# Altium footprint library ref-packages.PCBLIB: 1543 footprints (part 36 of 103)
Each footprint in its own frame and in the unit in brackets; x right, y up, seen from the top. Pads: shape width x height; smd on the part's side, far side on the other; paste and mask are expansions set on the pad; w line width, h text height; cw(c..) or ccw(c..) is an arc to the next point about the centre after c.
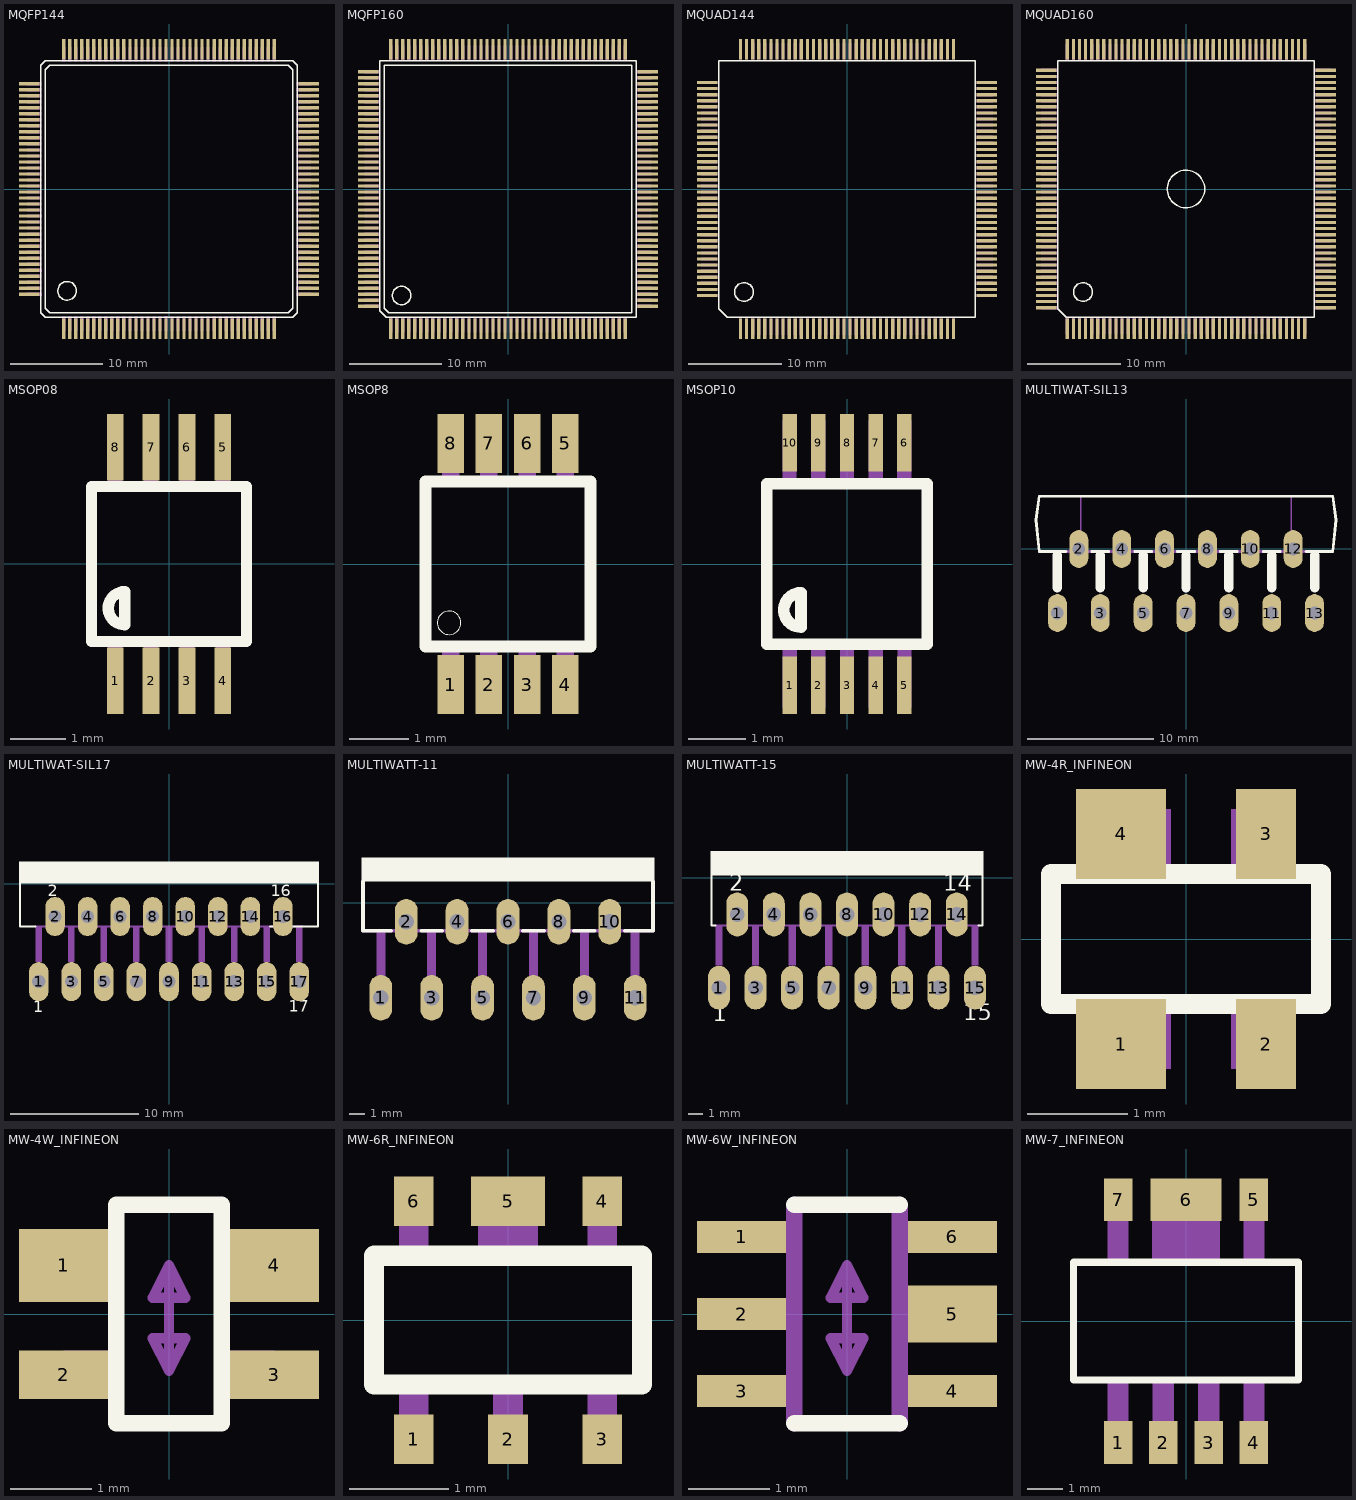
[diagram p35: the footprints below, top view; thin cyan lines are the x and y axes]

## MQFP144 [mm]
pads (144):
  rect 0.35x2.2 smd: 1(-11.375,-15.1) 2(-10.725,-15.1) 3(-10.075,-15.1) 4(-9.425,-15.1) 5(-8.775,-15.1) 6(-8.125,-15.1) 7(-7.475,-15.1) 8(-6.825,-15.1) 9(-6.175,-15.1) 10(-5.525,-15.1) 11(-4.875,-15.1) 12(-4.225,-15.1) 13(-3.575,-15.1) 14(-2.925,-15.1) 15(-2.275,-15.1) 16(-1.625,-15.1) 17(-0.975,-15.1) 18(-0.325,-15.1) 19(0.325,-15.1) 20(0.975,-15.1) 21(1.625,-15.1) 22(2.275,-15.1) 23(2.925,-15.1) 24(3.575,-15.1) 25(4.225,-15.1) 26(4.875,-15.1) 27(5.525,-15.1) 28(6.175,-15.1) 29(6.825,-15.1) 30(7.475,-15.1) 31(8.125,-15.1) 32(8.775,-15.1) 33(9.425,-15.1) 34(10.075,-15.1) 35(10.725,-15.1) 36(11.375,-15.1) 73(11.375,15.1) 74(10.725,15.1) 75(10.075,15.1) 76(9.425,15.1) 77(8.775,15.1) 78(8.125,15.1) 79(7.475,15.1) 80(6.825,15.1) 81(6.175,15.1) 82(5.525,15.1) 83(4.875,15.1) 84(4.225,15.1) 85(3.575,15.1) 86(2.925,15.1) 87(2.275,15.1) 88(1.625,15.1) 89(0.975,15.1) 90(0.325,15.1) 91(-0.325,15.1) 92(-0.975,15.1) 93(-1.625,15.1) 94(-2.275,15.1) 95(-2.925,15.1) 96(-3.575,15.1) 97(-4.225,15.1) 98(-4.875,15.1) 99(-5.525,15.1) 100(-6.175,15.1) 101(-6.825,15.1) 102(-7.475,15.1) 103(-8.125,15.1) 104(-8.775,15.1) 105(-9.425,15.1) 106(-10.075,15.1) 107(-10.725,15.1) 108(-11.375,15.1)
  rect 2.2x0.35 smd: 37(15.1,-11.375) 38(15.1,-10.725) 39(15.1,-10.075) 40(15.1,-9.425) 41(15.1,-8.775) 42(15.1,-8.125) 43(15.1,-7.475) 44(15.1,-6.825) 45(15.1,-6.175) 46(15.1,-5.525) 47(15.1,-4.875) 48(15.1,-4.225) 49(15.1,-3.575) 50(15.1,-2.925) 51(15.1,-2.275) 52(15.1,-1.625) 53(15.1,-0.975) 54(15.1,-0.325) 55(15.1,0.325) 56(15.1,0.975) 57(15.1,1.625) 58(15.1,2.275) 59(15.1,2.925) 60(15.1,3.575) 61(15.1,4.225) 62(15.1,4.875) 63(15.1,5.525) 64(15.1,6.175) 65(15.1,6.825) 66(15.1,7.475) 67(15.1,8.125) 68(15.1,8.775) 69(15.1,9.425) 70(15.1,10.075) 71(15.1,10.725) 72(15.1,11.375) 109(-15.1,11.375) 110(-15.1,10.725) 111(-15.1,10.075) 112(-15.1,9.425) 113(-15.1,8.775) 114(-15.1,8.125) 115(-15.1,7.475) 116(-15.1,6.825) 117(-15.1,6.175) 118(-15.1,5.525) 119(-15.1,4.875) 120(-15.1,4.225) 121(-15.1,3.575) 122(-15.1,2.925) 123(-15.1,2.275) 124(-15.1,1.625) 125(-15.1,0.975) 126(-15.1,0.325) 127(-15.1,-0.325) 128(-15.1,-0.975) 129(-15.1,-1.625) 130(-15.1,-2.275) 131(-15.1,-2.925) 132(-15.1,-3.575) 133(-15.1,-4.225) 134(-15.1,-4.875) 135(-15.1,-5.525) 136(-15.1,-6.175) 137(-15.1,-6.825) 138(-15.1,-7.475) 139(-15.1,-8.125) 140(-15.1,-8.775) 141(-15.1,-9.425) 142(-15.1,-10.075) 143(-15.1,-10.725) 144(-15.1,-11.375)
Top Overlay:
  circle w0.152: c-11,-11 r1
  lines w0.152: -13.873,-13.373 -13.373,-13.873 13.373,-13.873 13.873,-13.373 13.873,13.373 13.373,13.873 -13.373,13.873 -13.873,13.373 -13.873,-13.373 ; -13.373,-12.873 -12.873,-13.373 12.873,-13.373 13.373,-12.873 13.373,12.873 12.873,13.373 -12.873,13.373 -13.373,12.873 -13.373,-12.873
Mechanical 16:
  rectangle: -11.55,13.746 -11.2,15.346
  rectangle: -10.9,13.746 -10.55,15.346
  rectangle: -10.25,13.746 -9.9,15.346
  rectangle: -9.6,13.746 -9.25,15.346
  rectangle: -8.95,13.746 -8.6,15.346
  rectangle: -8.3,13.746 -7.95,15.346
  rectangle: -7.65,13.746 -7.3,15.346
  rectangle: -7,13.746 -6.65,15.346
  rectangle: -6.35,13.746 -6,15.346
  rectangle: -5.7,13.746 -5.35,15.346
  rectangle: -5.05,13.746 -4.7,15.346
  rectangle: -4.4,13.746 -4.05,15.346
  rectangle: -3.75,13.746 -3.4,15.346
  rectangle: -3.1,13.746 -2.75,15.346
  rectangle: -2.45,13.746 -2.1,15.346
  rectangle: -1.8,13.746 -1.45,15.346
  rectangle: -1.15,13.746 -0.8,15.346
  rectangle: -0.5,13.746 -0.15,15.346
  rectangle: 0.15,13.746 0.5,15.346
  rectangle: 0.8,13.746 1.15,15.346
  rectangle: 1.45,13.746 1.8,15.346
  rectangle: 2.1,13.746 2.45,15.346
  rectangle: 2.75,13.746 3.1,15.346
  rectangle: 3.4,13.746 3.75,15.346
  rectangle: 4.05,13.746 4.4,15.346
  rectangle: 4.7,13.746 5.05,15.346
  rectangle: 5.35,13.746 5.7,15.346
  rectangle: 6,13.746 6.35,15.346
  rectangle: 6.65,13.746 7,15.346
  rectangle: 7.3,13.746 7.65,15.346
  rectangle: 7.95,13.746 8.3,15.346
  rectangle: 8.6,13.746 8.95,15.346
  rectangle: 9.25,13.746 9.6,15.346
  rectangle: 9.9,13.746 10.25,15.346
  rectangle: 10.55,13.746 10.9,15.346
  rectangle: 11.2,13.746 11.55,15.346
  rectangle: 13.746,11.2 15.346,11.55
  rectangle: 13.746,10.55 15.346,10.9
  rectangle: 13.746,9.9 15.346,10.25
  rectangle: 13.746,9.25 15.346,9.6
  rectangle: 13.746,8.6 15.346,8.95
  rectangle: 13.746,7.95 15.346,8.3
  rectangle: 13.746,7.3 15.346,7.65
  rectangle: 13.721,6 15.346,6.35
  rectangle: 13.746,5.35 15.346,5.7
  rectangle: 13.746,4.7 15.346,5.05
  rectangle: 13.746,4.05 15.346,4.4
  rectangle: 13.746,6.65 15.346,7
  rectangle: 13.746,3.4 15.346,3.75
  rectangle: 13.746,2.75 15.346,3.1
  rectangle: 13.746,2.1 15.346,2.45
  rectangle: 13.746,1.45 15.346,1.8
  rectangle: 13.746,0.8 15.346,1.15
  rectangle: 13.746,0.15 15.346,0.5
  rectangle: 13.721,-0.5 15.346,-0.15
  rectangle: 13.746,-1.15 15.346,-0.8
  rectangle: 13.746,-1.8 15.346,-1.45
  rectangle: 13.771,-2.45 15.346,-2.1
  rectangle: 13.746,-3.1 15.346,-2.75
  rectangle: 13.746,-3.75 15.346,-3.4
  rectangle: 13.746,-4.4 15.346,-4.05
  rectangle: 13.746,-5.05 15.346,-4.7
  rectangle: 13.746,-5.7 15.346,-5.35
  rectangle: 13.746,-6.35 15.346,-6
  rectangle: 13.746,-7 15.346,-6.65
  rectangle: 13.746,-7.65 15.346,-7.3
  rectangle: 13.721,-7.95 13.746,-7.925
  rectangle: 13.746,-8.3 15.346,-7.95
  rectangle: 13.746,-8.95 15.346,-8.6
  rectangle: 13.746,-9.6 15.346,-9.25
  rectangle: 13.746,-10.25 15.346,-9.9
  rectangle: 13.721,-10.9 15.346,-10.55
  rectangle: 13.746,-11.55 15.346,-11.2
  rectangle: -15.346,11.2 -13.746,11.55
  rectangle: -15.346,10.55 -13.746,10.9
  rectangle: -15.346,9.9 -13.746,10.25
  rectangle: -15.346,9.25 -13.746,9.6
  rectangle: -15.346,8.6 -13.746,8.95
  rectangle: -15.346,7.95 -13.746,8.3
  rectangle: -15.346,7.3 -13.746,7.65
  rectangle: -15.346,6.65 -13.746,7
  rectangle: -15.346,6 -13.746,6.35
  rectangle: -15.346,5.35 -13.746,5.7
  rectangle: -15.346,4.7 -13.746,5.05
  rectangle: -15.346,4.05 -13.771,4.4
  rectangle: -15.346,3.4 -13.746,3.75
  rectangle: -15.346,2.75 -13.746,3.1
  rectangle: -15.346,2.1 -13.746,2.45
  rectangle: -15.346,1.45 -13.746,1.8
  rectangle: -15.346,0.8 -13.746,1.15
  rectangle: -15.346,0.15 -13.746,0.5
  rectangle: -15.346,-0.5 -13.746,-0.15
  rectangle: -15.346,-1.15 -13.746,-0.8
  rectangle: -15.346,-1.8 -13.746,-1.45
  rectangle: -15.346,-2.45 -13.746,-2.1
  rectangle: -15.346,-3.1 -13.721,-2.75
  rectangle: -15.346,-3.75 -13.746,-3.4
  rectangle: -15.346,-4.4 -13.746,-4.05
  rectangle: -15.346,-5.05 -13.746,-4.7
  rectangle: -15.346,-5.7 -13.746,-5.35
  rectangle: -15.346,-6.35 -13.746,-6
  rectangle: -15.346,-7 -13.746,-6.65
  rectangle: -15.346,-7.65 -13.746,-7.3
  rectangle: -15.346,-8.3 -13.746,-7.95
  rectangle: -15.346,-8.95 -13.721,-8.6
  rectangle: -15.346,-9.6 -13.746,-9.25
  rectangle: -15.346,-10.25 -13.746,-9.9
  rectangle: -15.346,-10.9 -13.746,-10.55
  rectangle: -15.346,-11.55 -13.721,-11.2
  rectangle: -11.55,-15.346 -11.2,-13.746
  rectangle: -10.9,-15.346 -10.55,-13.746
  rectangle: -10.25,-15.346 -9.9,-13.746
  rectangle: -9.6,-15.346 -9.25,-13.746
  rectangle: -8.95,-15.346 -8.6,-13.746
  rectangle: -8.3,-15.346 -7.95,-13.746
  rectangle: -7.65,-15.346 -7.3,-13.746
  rectangle: -7,-15.346 -6.65,-13.746
  rectangle: -6.35,-15.346 -6,-13.746
  rectangle: -5.7,-15.346 -5.35,-13.746
  rectangle: -5.05,-15.346 -4.7,-13.746
  rectangle: -4.4,-15.346 -4.05,-13.746
  rectangle: -3.75,-15.346 -3.4,-13.746
  rectangle: -3.1,-15.346 -2.75,-13.746
  rectangle: -2.45,-15.346 -2.1,-13.746
  rectangle: -1.8,-15.346 -1.45,-13.746
  rectangle: -1.15,-15.346 -0.8,-13.746
  rectangle: -0.5,-15.346 -0.15,-13.721
  rectangle: 0.15,-15.346 0.5,-13.746
  rectangle: 0.8,-13.796 0.825,-13.771
  rectangle: 0.8,-15.346 1.15,-13.746
  rectangle: 1.45,-15.346 1.8,-13.746
  rectangle: 2.1,-15.346 2.45,-13.746
  rectangle: 2.75,-15.346 3.1,-13.746
  rectangle: 3.4,-15.346 3.75,-13.746
  rectangle: 4.05,-15.346 4.4,-13.746
  rectangle: 4.7,-15.346 5.05,-13.746
  rectangle: 5.375,-15.346 5.7,-13.746
  rectangle: 6,-15.346 6.35,-13.746
  rectangle: 6.65,-15.346 7,-13.746
  rectangle: 7.3,-15.346 7.65,-13.746
  rectangle: 7.95,-15.346 8.3,-13.746
  rectangle: 8.6,-15.346 8.95,-13.746
  rectangle: 9.25,-15.346 9.6,-13.746
  rectangle: 9.9,-15.346 10.25,-13.746
  rectangle: 10.55,-15.346 10.9,-13.746
  rectangle: 11.2,-15.346 11.55,-13.746

## MQFP160 [mm]
pads (160):
  rect 0.35x2.2 smd: 1(-12.675,-15.1) 2(-12.025,-15.1) 3(-11.375,-15.1) 4(-10.725,-15.1) 5(-10.075,-15.1) 6(-9.425,-15.1) 7(-8.775,-15.1) 8(-8.125,-15.1) 9(-7.475,-15.1) 10(-6.825,-15.1) 11(-6.175,-15.1) 12(-5.525,-15.1) 13(-4.875,-15.1) 14(-4.225,-15.1) 15(-3.575,-15.1) 16(-2.925,-15.1) 17(-2.275,-15.1) 18(-1.625,-15.1) 19(-0.975,-15.1) 20(-0.325,-15.1) 21(0.325,-15.1) 22(0.975,-15.1) 23(1.625,-15.1) 24(2.275,-15.1) 25(2.925,-15.1) 26(3.575,-15.1) 27(4.225,-15.1) 28(4.875,-15.1) 29(5.525,-15.1) 30(6.175,-15.1) 31(6.825,-15.1) 32(7.475,-15.1) 33(8.125,-15.1) 34(8.775,-15.1) 35(9.425,-15.1) 36(10.075,-15.1) 37(10.725,-15.1) 38(11.375,-15.1) 39(12.025,-15.1) 40(12.675,-15.1) 81(12.675,15.1) 82(12.025,15.1) 83(11.375,15.1) 84(10.725,15.1) 85(10.075,15.1) 86(9.425,15.1) 87(8.775,15.1) 88(8.125,15.1) 89(7.475,15.1) 90(6.825,15.1) 91(6.175,15.1) 92(5.525,15.1) 93(4.875,15.1) 94(4.225,15.1) 95(3.575,15.1) 96(2.925,15.1) 97(2.275,15.1) 98(1.625,15.1) 99(0.975,15.1) 100(0.325,15.1) 101(-0.325,15.1) 102(-0.975,15.1) 103(-1.625,15.1) 104(-2.275,15.1) 105(-2.925,15.1) 106(-3.575,15.1) 107(-4.225,15.1) 108(-4.875,15.1) 109(-5.525,15.1) 110(-6.175,15.1) 111(-6.825,15.1) 112(-7.475,15.1) 113(-8.125,15.1) 114(-8.775,15.1) 115(-9.425,15.1) 116(-10.075,15.1) 117(-10.725,15.1) 118(-11.375,15.1) 119(-12.025,15.1) 120(-12.675,15.1)
  rect 2.2x0.35 smd: 41(15.1,-12.675) 42(15.1,-12.025) 43(15.1,-11.375) 44(15.1,-10.725) 45(15.1,-10.075) 46(15.1,-9.425) 47(15.1,-8.775) 48(15.1,-8.125) 49(15.1,-7.475) 50(15.1,-6.825) 51(15.1,-6.175) 52(15.1,-5.525) 53(15.1,-4.875) 54(15.1,-4.225) 55(15.1,-3.575) 56(15.1,-2.925) 57(15.1,-2.275) 58(15.1,-1.625) 59(15.1,-0.975) 60(15.1,-0.325) 61(15.1,0.325) 62(15.1,0.975) 63(15.1,1.625) 64(15.1,2.275) 65(15.1,2.925) 66(15.1,3.575) 67(15.1,4.225) 68(15.1,4.875) 69(15.1,5.525) 70(15.1,6.175) 71(15.1,6.825) 72(15.1,7.475) 73(15.1,8.125) 74(15.1,8.775) 75(15.1,9.425) 76(15.1,10.075) 77(15.1,10.725) 78(15.1,11.375) 79(15.1,12.025) 80(15.1,12.675) 121(-15.1,12.675) 122(-15.1,12.025) 123(-15.1,11.375) 124(-15.1,10.725) 125(-15.1,10.075) 126(-15.1,9.425) 127(-15.1,8.775) 128(-15.1,8.125) 129(-15.1,7.475) 130(-15.1,6.825) 131(-15.1,6.175) 132(-15.1,5.525) 133(-15.1,4.875) 134(-15.1,4.225) 135(-15.1,3.575) 136(-15.1,2.925) 137(-15.1,2.275) 138(-15.1,1.625) 139(-15.1,0.975) 140(-15.1,0.325) 141(-15.1,-0.325) 142(-15.1,-0.975) 143(-15.1,-1.625) 144(-15.1,-2.275) 145(-15.1,-2.925) 146(-15.1,-3.575) 147(-15.1,-4.225) 148(-15.1,-4.875) 149(-15.1,-5.525) 150(-15.1,-6.175) 151(-15.1,-6.825) 152(-15.1,-7.475) 153(-15.1,-8.125) 154(-15.1,-8.775) 155(-15.1,-9.425) 156(-15.1,-10.075) 157(-15.1,-10.725) 158(-15.1,-11.375) 159(-15.1,-12.025) 160(-15.1,-12.675)
Top Overlay:
  circle w0.152: c-11.5,-11.5 r1
  lines w0.152: -13.873,-13.123 -13.873,13.873 13.873,13.873 13.873,-13.873 -13.123,-13.873 -13.873,-13.123 ; -13.373,-12.873 -12.873,-13.373 13.373,-13.373 13.373,13.373 -13.373,13.373 -13.373,-12.873
Mechanical 16:
  drawing of 162 lines, arcs and shapes, not listed

## MQUAD144 [mm]
pads (144):
  rect 0.35x2.2 smd: 1(-11.375,-14.92) 2(-10.725,-14.92) 3(-10.075,-14.92) 4(-9.425,-14.92) 5(-8.775,-14.92) 6(-8.125,-14.92) 7(-7.475,-14.92) 8(-6.825,-14.92) 9(-6.175,-14.92) 10(-5.525,-14.92) 11(-4.875,-14.92) 12(-4.225,-14.92) 13(-3.575,-14.92) 14(-2.925,-14.92) 15(-2.275,-14.92) 16(-1.625,-14.92) 17(-0.975,-14.92) 18(-0.325,-14.92) 19(0.325,-14.92) 20(0.975,-14.92) 21(1.625,-14.92) 22(2.275,-14.92) 23(2.925,-14.92) 24(3.575,-14.92) 25(4.225,-14.92) 26(4.875,-14.92) 27(5.525,-14.92) 28(6.175,-14.92) 29(6.825,-14.92) 30(7.475,-14.92) 31(8.125,-14.92) 32(8.775,-14.92) 33(9.425,-14.92) 34(10.075,-14.92) 35(10.725,-14.92) 36(11.375,-14.92) 73(11.375,14.92) 74(10.725,14.92) 75(10.075,14.92) 76(9.425,14.92) 77(8.775,14.92) 78(8.125,14.92) 79(7.475,14.92) 80(6.825,14.92) 81(6.175,14.92) 82(5.525,14.92) 83(4.875,14.92) 84(4.225,14.92) 85(3.575,14.92) 86(2.925,14.92) 87(2.275,14.92) 88(1.625,14.92) 89(0.975,14.92) 90(0.325,14.92) 91(-0.325,14.92) 92(-0.975,14.92) 93(-1.625,14.92) 94(-2.275,14.92) 95(-2.925,14.92) 96(-3.575,14.92) 97(-4.225,14.92) 98(-4.875,14.92) 99(-5.525,14.92) 100(-6.175,14.92) 101(-6.825,14.92) 102(-7.475,14.92) 103(-8.125,14.92) 104(-8.775,14.92) 105(-9.425,14.92) 106(-10.075,14.92) 107(-10.725,14.92) 108(-11.375,14.92)
  rect 2.2x0.35 smd: 37(14.92,-11.375) 38(14.92,-10.725) 39(14.92,-10.075) 40(14.92,-9.425) 41(14.92,-8.775) 42(14.92,-8.125) 43(14.92,-7.475) 44(14.92,-6.825) 45(14.92,-6.175) 46(14.92,-5.525) 47(14.92,-4.875) 48(14.92,-4.225) 49(14.92,-3.575) 50(14.92,-2.925) 51(14.92,-2.275) 52(14.92,-1.625) 53(14.92,-0.975) 54(14.92,-0.325) 55(14.92,0.325) 56(14.92,0.975) 57(14.92,1.625) 58(14.92,2.275) 59(14.92,2.925) 60(14.92,3.575) 61(14.92,4.225) 62(14.92,4.875) 63(14.92,5.525) 64(14.92,6.175) 65(14.92,6.825) 66(14.92,7.475) 67(14.92,8.125) 68(14.92,8.775) 69(14.92,9.425) 70(14.92,10.075) 71(14.92,10.725) 72(14.92,11.375) 109(-14.92,11.375) 110(-14.92,10.725) 111(-14.92,10.075) 112(-14.92,9.425) 113(-14.92,8.775) 114(-14.92,8.125) 115(-14.92,7.475) 116(-14.92,6.825) 117(-14.92,6.175) 118(-14.92,5.525) 119(-14.92,4.875) 120(-14.92,4.225) 121(-14.92,3.575) 122(-14.92,2.925) 123(-14.92,2.275) 124(-14.92,1.625) 125(-14.92,0.975) 126(-14.92,0.325) 127(-14.92,-0.325) 128(-14.92,-0.975) 129(-14.92,-1.625) 130(-14.92,-2.275) 131(-14.92,-2.925) 132(-14.92,-3.575) 133(-14.92,-4.225) 134(-14.92,-4.875) 135(-14.92,-5.525) 136(-14.92,-6.175) 137(-14.92,-6.825) 138(-14.92,-7.475) 139(-14.92,-8.125) 140(-14.92,-8.775) 141(-14.92,-9.425) 142(-14.92,-10.075) 143(-14.92,-10.725) 144(-14.92,-11.375)
Top Overlay:
  circle w0.152: c-11,-11 r1
  lines w0.152: -13.693,-12.793 -12.793,-13.693 13.693,-13.693 13.693,13.693 -13.693,13.693 -13.693,-12.793
Mechanical 16:
  rectangle: -11.55,-15.6 -11.2,-13.82
  rectangle: -10.9,-15.6 -10.55,-13.82
  rectangle: -10.25,-15.6 -9.9,-13.82
  rectangle: -9.6,-15.6 -9.25,-13.82
  rectangle: -8.95,-15.6 -8.6,-13.82
  rectangle: -8.3,-15.6 -7.95,-13.82
  rectangle: -7.65,-15.6 -7.3,-13.82
  rectangle: -7,-15.6 -6.65,-13.82
  rectangle: -6.35,-15.6 -6,-13.82
  rectangle: -5.7,-15.6 -5.35,-13.82
  rectangle: -5.05,-15.6 -4.7,-13.82
  rectangle: -4.4,-15.6 -4.05,-13.82
  rectangle: -3.75,-15.6 -3.4,-13.82
  rectangle: -2.45,-15.6 -2.1,-13.82
  rectangle: -3.1,-15.6 -2.75,-13.82
  rectangle: -1.8,-15.6 -1.45,-13.82
  rectangle: -1.15,-15.6 -0.8,-13.82
  rectangle: -0.5,-15.6 -0.15,-13.82
  rectangle: 0.15,-15.6 0.5,-13.82
  rectangle: 0.8,-15.6 1.15,-13.82
  rectangle: 1.45,-15.6 1.8,-13.82
  rectangle: 2.1,-15.6 2.45,-13.82
  rectangle: 2.75,-15.6 3.1,-13.82
  rectangle: 3.4,-15.6 3.75,-13.82
  rectangle: 4.05,-15.6 4.4,-13.82
  rectangle: 4.7,-15.6 5.05,-13.82
  rectangle: 6,-15.6 6.35,-13.82
  rectangle: 5.35,-15.6 5.7,-13.82
  rectangle: 6.65,-15.6 7,-13.82
  rectangle: 7.3,-15.6 7.65,-13.82
  rectangle: 7.95,-15.6 8.3,-13.82
  rectangle: 8.6,-15.6 8.95,-13.82
  rectangle: 9.25,-15.6 9.6,-13.82
  rectangle: 9.9,-15.6 10.25,-13.82
  rectangle: 10.55,-15.6 10.9,-13.82
  rectangle: 11.2,-15.6 11.55,-13.82
  rectangle: 13.82,-11.55 15.6,-11.2
  rectangle: 13.82,-10.9 15.6,-10.55
  rectangle: 13.82,-10.25 15.6,-9.9
  rectangle: 13.82,-9.6 15.6,-9.25
  rectangle: 13.82,-8.95 15.6,-8.6
  rectangle: 13.82,-8.3 15.6,-7.95
  rectangle: 13.82,-7.65 15.6,-7.3
  rectangle: 13.82,-7 15.6,-6.65
  rectangle: 13.82,-6.35 15.6,-6
  rectangle: 13.82,-5.7 15.6,-5.35
  rectangle: 13.82,-5.05 15.6,-4.7
  rectangle: 13.82,-4.4 15.6,-4.05
  rectangle: 13.82,-3.75 15.6,-3.4
  rectangle: 13.82,-3.1 15.6,-2.75
  rectangle: 13.82,-2.45 15.6,-2.1
  rectangle: 13.82,-1.8 15.6,-1.45
  rectangle: 13.82,-1.15 15.6,-0.8
  rectangle: 13.82,-0.5 15.6,-0.15
  rectangle: 13.82,0.15 15.6,0.5
  rectangle: 13.82,0.8 15.6,1.15
  rectangle: 13.82,1.45 15.6,1.8
  rectangle: 13.82,2.1 15.6,2.45
  rectangle: 13.82,2.75 15.6,3.1
  rectangle: 13.82,3.4 15.6,3.75
  rectangle: 13.82,4.05 15.6,4.4
  rectangle: 13.82,4.7 15.6,5.05
  rectangle: 13.82,5.35 15.6,5.7
  rectangle: 13.82,6 15.6,6.35
  rectangle: 13.82,6.65 15.6,7
  rectangle: 13.82,7.3 15.6,7.65
  rectangle: 13.82,7.95 15.6,8.3
  rectangle: 13.82,8.6 15.6,8.95
  rectangle: 13.82,9.25 15.6,9.6
  rectangle: 13.82,9.9 15.6,10.25
  rectangle: 13.82,10.55 15.6,10.9
  rectangle: 13.82,11.2 15.6,11.55
  rectangle: 11.2,13.82 11.55,15.6
  rectangle: 10.55,13.82 10.9,15.6
  rectangle: 9.9,13.82 10.25,15.6
  rectangle: 9.25,13.82 9.6,15.6
  rectangle: 8.6,13.82 8.95,15.6
  rectangle: 7.95,13.82 8.3,15.6
  rectangle: 7.3,13.82 7.65,15.6
  rectangle: 6.65,13.82 7,15.6
  rectangle: 6,13.82 6.35,15.6
  rectangle: 5.35,13.82 5.7,15.6
  rectangle: 4.7,13.82 5.05,15.6
  rectangle: 4.05,13.82 4.4,15.6
  rectangle: 3.4,13.82 3.75,15.6
  rectangle: 2.75,13.82 3.1,15.6
  rectangle: 2.1,13.82 2.45,15.6
  rectangle: 1.45,13.82 1.8,15.6
  rectangle: 0.8,13.82 1.15,15.6
  rectangle: 0.15,13.82 0.5,15.6
  rectangle: -0.5,13.82 -0.15,15.6
  rectangle: -1.15,13.82 -0.8,15.6
  rectangle: -1.8,13.82 -1.45,15.6
  rectangle: -2.45,13.82 -2.1,15.6
  rectangle: -3.1,13.82 -2.75,15.6
  rectangle: -3.75,13.82 -3.4,15.6
  rectangle: -4.4,13.82 -4.05,15.6
  rectangle: -5.05,13.82 -4.7,15.6
  rectangle: -6.35,13.82 -6,15.6
  rectangle: -5.7,13.82 -5.35,15.6
  rectangle: -7,13.82 -6.65,15.6
  rectangle: -7.65,13.82 -7.3,15.6
  rectangle: -8.3,13.82 -7.95,15.6
  rectangle: -8.95,13.82 -8.6,15.6
  rectangle: -9.6,13.82 -9.25,15.6
  rectangle: -10.25,13.82 -9.9,15.6
  rectangle: -10.9,13.82 -10.55,15.6
  rectangle: -11.55,13.82 -11.2,15.6
  rectangle: -15.6,11.2 -13.82,11.55
  rectangle: -15.6,10.55 -13.82,10.9
  rectangle: -15.6,9.9 -13.82,10.25
  rectangle: -15.6,9.25 -13.82,9.6
  rectangle: -15.6,8.6 -13.82,8.95
  rectangle: -15.6,7.95 -13.82,8.3
  rectangle: -15.6,7.3 -13.82,7.65
  rectangle: -15.6,6.65 -13.82,7
  rectangle: -15.6,6 -13.82,6.35
  rectangle: -15.6,5.35 -13.82,5.7
  rectangle: -15.6,4.7 -13.82,5.05
  rectangle: -15.6,4.05 -13.82,4.4
  rectangle: -15.6,3.4 -13.82,3.75
  rectangle: -15.6,2.75 -13.82,3.1
  rectangle: -15.6,2.1 -13.82,2.45
  rectangle: -15.6,1.45 -13.82,1.8
  rectangle: -15.6,0.8 -13.82,1.15
  rectangle: -15.6,0.15 -13.82,0.5
  rectangle: -15.6,-0.5 -13.82,-0.15
  rectangle: -15.6,-1.15 -13.82,-0.8
  rectangle: -15.6,-1.8 -13.82,-1.45
  rectangle: -15.6,-2.45 -13.82,-2.1
  rectangle: -15.6,-3.1 -13.82,-2.75
  rectangle: -15.6,-3.75 -13.82,-3.4
  rectangle: -15.6,-4.4 -13.82,-4.05
  rectangle: -15.6,-5.05 -13.82,-4.7
  rectangle: -15.6,-5.7 -13.82,-5.35
  rectangle: -15.6,-6.35 -13.82,-6
  rectangle: -15.6,-7 -13.82,-6.65
  rectangle: -15.6,-7.65 -13.82,-7.3
  rectangle: -15.6,-8.3 -13.82,-7.95
  rectangle: -15.6,-8.95 -13.82,-8.6
  rectangle: -15.6,-9.6 -13.82,-9.25
  rectangle: -15.6,-10.25 -13.82,-9.9
  rectangle: -15.6,-10.9 -13.82,-10.55
  rectangle: -15.6,-11.55 -13.82,-11.2

## MQUAD160 [mm]
pads (160):
  rect 0.35x2.2 smd: 1(-12.675,-14.92) 2(-12.025,-14.92) 3(-11.375,-14.92) 4(-10.725,-14.92) 5(-10.075,-14.92) 6(-9.425,-14.92) 7(-8.775,-14.92) 8(-8.125,-14.92) 9(-7.475,-14.92) 10(-6.825,-14.92) 11(-6.175,-14.92) 12(-5.525,-14.92) 13(-4.875,-14.92) 14(-4.225,-14.92) 15(-3.575,-14.92) 16(-2.925,-14.92) 17(-2.275,-14.92) 18(-1.625,-14.92) 19(-0.975,-14.92) 20(-0.325,-14.92) 21(0.325,-14.92) 22(0.975,-14.92) 23(1.625,-14.92) 24(2.275,-14.92) 25(2.925,-14.92) 26(3.575,-14.92) 27(4.225,-14.92) 28(4.875,-14.92) 29(5.525,-14.92) 30(6.175,-14.92) 31(6.825,-14.92) 32(7.475,-14.92) 33(8.125,-14.92) 34(8.775,-14.92) 35(9.425,-14.92) 36(10.075,-14.92) 37(10.725,-14.92) 38(11.375,-14.92) 39(12.025,-14.92) 40(12.675,-14.92) 81(12.675,14.92) 82(12.025,14.92) 83(11.375,14.92) 84(10.725,14.92) 85(10.075,14.92) 86(9.425,14.92) 87(8.775,14.92) 88(8.125,14.92) 89(7.475,14.92) 90(6.825,14.92) 91(6.175,14.92) 92(5.525,14.92) 93(4.875,14.92) 94(4.225,14.92) 95(3.575,14.92) 96(2.925,14.92) 97(2.275,14.92) 98(1.625,14.92) 99(0.975,14.92) 100(0.325,14.92) 101(-0.325,14.92) 102(-0.975,14.92) 103(-1.625,14.92) 104(-2.275,14.92) 105(-2.925,14.92) 106(-3.575,14.92) 107(-4.225,14.92) 108(-4.875,14.92) 109(-5.525,14.92) 110(-6.175,14.92) 111(-6.825,14.92) 112(-7.475,14.92) 113(-8.125,14.92) 114(-8.775,14.92) 115(-9.425,14.92) 116(-10.075,14.92) 117(-10.725,14.92) 118(-11.375,14.92) 119(-12.025,14.92) 120(-12.675,14.92)
  rect 2.2x0.35 smd: 41(14.92,-12.675) 42(14.92,-12.025) 43(14.92,-11.375) 44(14.92,-10.725) 45(14.92,-10.075) 46(14.92,-9.425) 47(14.92,-8.775) 48(14.92,-8.125) 49(14.92,-7.475) 50(14.92,-6.825) 51(14.92,-6.175) 52(14.92,-5.525) 53(14.92,-4.875) 54(14.92,-4.225) 55(14.92,-3.575) 56(14.92,-2.925) 57(14.92,-2.275) 58(14.92,-1.625) 59(14.92,-0.975) 60(14.92,-0.325) 61(14.92,0.325) 62(14.92,0.975) 63(14.92,1.625) 64(14.92,2.275) 65(14.92,2.925) 66(14.92,3.575) 67(14.92,4.225) 68(14.92,4.875) 69(14.92,5.525) 70(14.92,6.175) 71(14.92,6.825) 72(14.92,7.475) 73(14.92,8.125) 74(14.92,8.775) 75(14.92,9.425) 76(14.92,10.075) 77(14.92,10.725) 78(14.92,11.375) 79(14.92,12.025) 80(14.92,12.675) 121(-14.92,12.675) 122(-14.92,12.025) 123(-14.92,11.375) 124(-14.92,10.725) 125(-14.92,10.075) 126(-14.92,9.425) 127(-14.92,8.775) 128(-14.92,8.125) 129(-14.92,7.475) 130(-14.92,6.825) 131(-14.92,6.175) 132(-14.92,5.525) 133(-14.92,4.875) 134(-14.92,4.225) 135(-14.92,3.575) 136(-14.92,2.925) 137(-14.92,2.275) 138(-14.92,1.625) 139(-14.92,0.975) 140(-14.92,0.325) 141(-14.92,-0.325) 142(-14.92,-0.975) 143(-14.92,-1.625) 144(-14.92,-2.275) 145(-14.92,-2.925) 146(-14.92,-3.575) 147(-14.92,-4.225) 148(-14.92,-4.875) 149(-14.92,-5.525) 150(-14.92,-6.175) 151(-14.92,-6.825) 152(-14.92,-7.475) 153(-14.92,-8.125) 154(-14.92,-8.775) 155(-14.92,-9.425) 156(-14.92,-10.075) 157(-14.92,-10.725) 158(-14.92,-11.375) 159(-14.92,-12.025) 160(-14.92,-12.675)
Top Overlay:
  circle w0.152: c-11,-11 r1
  circle w0.152: c0,0 r2
  lines w0.152: -13.693,-12.793 -12.793,-13.693 13.693,-13.693 13.693,13.693 -13.693,13.693 -13.693,-12.793
Mechanical 16:
  drawing of 160 lines, arcs and shapes, not listed

## MSOP08 [mil]
pads (8):
  rect 11.81x47.24 smd: 1(-38.41,-83.19) 2(-12.82,-83.19) 3(12.77,-83.19) 4(38.36,-83.19) 5(38.36,83.15) 6(12.77,83.15) 7(-12.82,83.15) 8(-38.41,83.15)
Top Overlay:
  lines w8: -55.12,-55.12 55.12,-55.12 55.12,55.12 -55.12,55.12 -55.12,-55.12 ; -31.5,-43.31 cw(c-31.5,-31.5) -31.5,-19.69 -31.5,-43.31
Mechanical 16:
  rectangle: -43.31,-98.43 -33.46,-59.06
  rectangle: -17.72,-98.43 -7.87,-59.06
  rectangle: 7.87,-98.43 17.72,-59.06
  rectangle: 7.87,-98.43 17.72,-59.06
  rectangle: 33.46,-98.43 43.31,-59.06
  rectangle: 33.46,59.06 43.31,98.43
  rectangle: 7.87,59.06 17.72,98.43
  rectangle: -17.72,59.06 -7.87,98.43
  rectangle: -43.31,59.06 -33.46,98.43

## MSOP8 [mm]
pads (8):
  rect 0.45x1 smd: 1(-0.975,-2.05) 2(-0.325,-2.05) 3(0.325,-2.05) 4(0.975,-2.05) 5(0.975,2.05) 6(0.325,2.05) 7(-0.325,2.05) 8(-0.975,2.05)
Top Overlay:
  circle w0: c-1,-1 r0.2
  lines w0.203: -1.4,-1.4 1.4,-1.4 1.4,1.4 -1.4,1.4 -1.4,-1.4
Mechanical 16:
  rectangle: -1.125,-2.45 -0.826,-1.5
  rectangle: -0.475,-2.45 -0.175,-1.5
  rectangle: 0.175,-2.45 0.475,-1.5
  rectangle: 0.825,-2.45 1.125,-1.5
  rectangle: 0.826,1.5 1.125,2.45
  rectangle: 0.175,1.5 0.475,2.45
  rectangle: -0.475,1.5 -0.175,2.45
  rectangle: -1.125,1.5 -0.825,2.45

## MSOP10 [mm]
pads (10):
  rect 0.25x1 smd: 1(-1,-2.113) 2(-0.5,-2.113) 3(0,-2.113) 4(0.5,-2.113) 5(1,-2.113) 6(1,2.113) 7(0.5,2.113) 8(0,2.113) 9(-0.5,2.113) 10(-1,2.113)
Top Overlay:
  lines w0.203: -1.4,-1.4 1.4,-1.4 1.4,1.4 -1.4,1.4 -1.4,-1.4 ; -0.8,-1.1 cw(c-0.8,-0.8) -0.8,-0.5 -0.8,-1.1
Mechanical 16:
  rectangle: -1.124,-2.5 -0.875,-1.5
  rectangle: -0.624,-2.5 -0.374,-1.5
  rectangle: -0.124,-2.5 0.125,-1.5
  rectangle: 0.376,-2.5 0.626,-1.5
  rectangle: 0.876,-2.5 1.126,-1.5
  region: 1.124,2.5 0.875,2.5 0.875,1.5 1.124,1.5
  region: 0.624,2.5 0.374,2.5 0.374,1.5 0.624,1.5
  region: 0.124,2.5 -0.125,2.5 -0.125,1.5 0.124,1.5
  region: -0.376,2.5 -0.626,2.5 -0.626,1.5 -0.376,1.5
  region: -0.876,2.5 -1.126,2.5 -1.126,1.5 -0.876,1.5

## MULTIWAT-SIL13 [mm]
pads (13):
  oval 1.5x3 hole 1: 1(-10.2,-5.08) 2(-8.5,0) 3(-6.8,-5.08) 4(-5.1,0) 5(-3.4,-5.08) 6(-1.7,0) 7(0,-5.08) 8(1.7,0) 9(3.4,-5.08) 10(5.1,0) 11(6.8,-5.08) 12(8.5,0) 13(10.2,-5.08)
Top Overlay:
  lines w0.203: -9.52,-0.2 -11.65,-0.2 -11.9,2.3 -11.65,4.2 11.65,4.2 11.9,2.3 11.65,-0.2 9.52,-0.2 ; -7.48,-0.2 -6.12,-0.2 ; -4.08,-0.2 -2.72,-0.2 ; -0.68,-0.2 0.68,-0.2 ; 2.72,-0.2 4.08,-0.2 ; 6.12,-0.2 7.48,-0.2
  lines w0.75: -10.2,-3.06 -10.2,-0.51 ; -6.8,-3.06 -6.8,-0.51 ; -3.4,-3.06 -3.4,-0.51 ; 0,-3.06 0,-0.51 ; 3.4,-3.06 3.4,-0.51 ; 6.8,-3.06 6.8,-0.51 ; 10.2,-3.06 10.2,-0.51
Mechanical 13:
  lines w0.102: -8.35,-0.1 -8.35,4.1 ; 8.35,-0.1 8.35,4.1
Mechanical 16:
  lines w0.203: -9.52,-0.2 -7.48,-0.2 ; -6.12,-0.2 -4.08,-0.2 ; -2.72,-0.2 -0.68,-0.2 ; 0.68,-0.2 2.72,-0.2 ; 4.08,-0.2 6.12,-0.2 ; 7.48,-0.2 9.52,-0.2

## MULTIWAT-SIL17 [mil]
pads (17):
  oval 60x120 hole 40: 1(-400,-300) 2(-350,-100) 3(-300,-300) 4(-250,-100) 5(-200,-300) 6(-150,-100) 7(-100,-300) 8(-50,-100) 9(0,-300) 10(50,-100) 11(100,-300) 12(150,-100) 13(200,-300) 14(250,-100) 15(300,-300) 16(350,-100) 17(400,-300)
Top Overlay:
  rectangle: -460.63,1.97 460.63,68.9
  lines w6: -457.4,10 -457.4,-130 -410,-130 ; 310,-130 457.4,-130 457.4,10
  text "1" at -417.22,-407.02 h62
  text "17" at 367.23,-404.69 h62
  text "2" at -371.91,-50 h62
  text "16" at 312.54,-50 h62
Mechanical 16:
  rectangle: -410,-240 -390,-130
  rectangle: -310,-240 -290,-130
  rectangle: -210,-240 -190,-130
  rectangle: -110,-240 -90,-130
  rectangle: -10,-240 10,-130
  rectangle: 90,-240 110,-130
  rectangle: 190,-240 210,-130
  rectangle: 290,-240 310,-130
  rectangle: 390,-240 410,-130
  lines w6: -410,-130 -310,-130 ; 310,-130 -310,-130 ; 410,-130 -310,-130

## MULTIWATT-11 [mil]
pads (11):
  oval 60x120 hole 40: 1(-334.65,-250) 2(-267.72,-50) 3(-200.79,-250) 4(-133.86,-50) 5(-66.93,-250) 6(0,-50) 7(66.93,-250) 8(133.86,-50) 9(200.79,-250) 10(267.72,-50) 11(334.65,-250)
Top Overlay:
  rectangle: -385.83,56.3 385.83,119.29
  lines w10: -381.89,56.3 -381.89,-73.62 -307.09,-73.62 ; -228.35,-73.62 -173.23,-73.62 ; -94.49,-73.62 -39.37,-73.62 ; 39.37,-73.62 94.49,-73.62 ; 173.23,-73.62 228.35,-73.62 ; 307.09,-73.62 381.89,-73.62 381.89,56.3
Mechanical 16:
  rectangle: -346.46,-258.66 -322.83,-211.42
  rectangle: -346.46,-215.35 -322.83,-77.56
  rectangle: -212.6,-258.66 -188.98,-211.42
  rectangle: -212.6,-215.35 -188.98,-77.56
  rectangle: -78.74,-258.66 -55.12,-211.42
  rectangle: -78.74,-215.35 -55.12,-77.56
  rectangle: 55.12,-258.66 78.74,-211.42
  rectangle: 55.12,-215.35 78.74,-77.56
  rectangle: 188.98,-258.66 212.6,-211.42
  rectangle: 188.98,-215.35 212.6,-77.56
  rectangle: 322.83,-258.66 346.46,-211.42
  rectangle: 322.83,-215.35 346.46,-77.56
  lines w10: -381.89,-73.62 381.89,-73.62

## MULTIWATT-15 [mil]
pads (15):
  oval 60x120 hole 40: 1(-350,-300) 2(-300,-100) 3(-250,-300) 4(-200,-100) 5(-150,-300) 6(-100,-100) 7(-50,-300) 8(0,-100) 9(50,-300) 10(100,-100) 11(150,-300) 12(200,-100) 13(250,-300) 14(300,-100) 15(350,-300)
Top Overlay:
  rectangle: -373.03,6.89 373.03,72.83
  lines w6: -370,10 -370,-130 -360,-130 ; 360,-130 370,-130 370,10
  text "1" at -367.22,-407.02 h77.5
  text "15" at 317.23,-404.69 h77.5
  text "2" at -321.91,-50 h77.5
  text "14" at 262.54,-50 h77.5
Mechanical 16:
  rectangle: -360,-240 -340,-130
  rectangle: -260,-240 -240,-130
  rectangle: -160,-240 -140,-130
  rectangle: -60,-240 -40,-130
  rectangle: 40,-240 60,-130
  rectangle: 140,-240 160,-130
  rectangle: 240,-240 260,-130
  rectangle: 340,-240 360,-130
  lines w6: -360,-130 360,-130

## MW-4R_INFINEON [mil]
pads (4):
  rect 35.43x35.43 smd: 1(-25.59,-41.34) 4(-25.59,41.34)
  rect 23.62x35.43 smd: 2(31.5,-41.34) 3(31.5,41.34)
Top Overlay:
  lines w8: -53.15,-25.59 -53.15,25.59 53.15,25.59 53.15,-25.59 -53.15,-25.59
Mechanical 16:
  rectangle: 17.72,-51.18 33.46,-27.56
  rectangle: 17.72,27.56 33.46,51.18
  rectangle: -33.46,27.56 -5.91,51.18
  rectangle: -33.46,-51.18 -5.91,-27.56

## MW-4W_INFINEON [mil]
pads (4):
  rect 43.31x35.43 smd: 1(-51.18,23.62) 4(51.18,23.62)
  rect 43.31x23.62 smd: 2(-51.18,-29.53) 3(51.18,-29.53)
Top Overlay:
  lines w8: -25.59,-53.15 -25.59,53.15 25.59,53.15 25.59,-53.15 -25.59,-53.15
Mechanical 13:
  lines w5: 0,-27.56 0,23.62 ; 0,-27.56 7.87,-11.81 -7.87,-11.81 0,-27.56 ; 0,23.62 -7.87,7.87 7.87,7.87 0,23.62
  text "direction of pcb" at 15.75,15.75 h15.5
  text "transportation for" at 15.75,-1.97 h15.5
  text "wavesoldering" at 15.75,-19.69 h15.5
Mechanical 16:
  rectangle: -51.18,-33.46 -27.56,-17.72
  rectangle: 27.56,-33.46 51.18,-17.72
  rectangle: 27.56,5.91 51.18,33.46
  rectangle: -51.18,5.91 -27.56,33.46

## MW-6R_INFINEON [mil]
pads (6):
  rect 15.75x19.69 smd: 1(-37.4,-47.24) 2(0,-47.24) 3(37.4,-47.24) 4(37.4,47.24) 6(-37.4,47.24)
  rect 29.53x19.69 smd: 5(0,47.24)
Top Overlay:
  lines w8: -53.15,-25.59 -53.15,25.59 53.15,25.59 53.15,-25.59 -53.15,-25.59
Mechanical 16:
  rectangle: -43.31,-51.18 -31.5,-27.56
  rectangle: -5.91,-51.18 5.91,-27.56
  rectangle: 31.5,-51.18 43.31,-27.56
  rectangle: 31.5,27.56 43.31,51.18
  rectangle: -43.31,27.56 -31.5,51.18
  rectangle: -11.81,27.56 11.81,51.18

## MW-6W_INFINEON [mil]
pads (6):
  rect 43.31x15.75 smd: 1(-51.18,37.4) 2(-51.18,0) 3(-51.18,-37.4) 4(51.18,-37.4) 6(51.18,37.4)
  rect 43.31x27.56 smd: 5(51.18,0)
Top Overlay:
  lines w8: -25.59,-53.15 25.59,-53.15 ; -25.59,53.15 25.59,53.15
Mechanical 13:
  lines w5: 0,-27.56 0,23.62 ; 0,-27.56 7.87,-11.81 -7.87,-11.81 0,-27.56 ; 0,23.62 -7.87,7.87 7.87,7.87 0,23.62
  text "direction of pcb" at 15.75,15.75 h15.5
  text "transportation for" at 15.75,-1.97 h15.5
  text "wavesoldering" at 15.75,-19.69 h15.5
Mechanical 16:
  rectangle: -51.18,31.5 -27.56,43.31
  rectangle: -51.18,-5.91 -27.56,5.91
  rectangle: -51.18,-43.31 -27.56,-31.5
  rectangle: 27.56,-43.31 51.18,-31.5
  rectangle: 27.56,31.5 51.18,43.31
  rectangle: 27.56,-11.81 51.18,11.81
  lines w8: -25.59,-53.15 -25.59,53.15 ; 25.59,-53.15 25.59,53.15

## MW-7_INFINEON [mil]
pads (7):
  rect 31.5x47.24 smd: 1(-74.8,-133.86) 2(-25.04,-133.86) 3(25,-133.9) 4(74.8,-133.86) 5(74.8,133.86) 7(-74.8,133.86)
  rect 78.74x47.24 smd: 6(0,133.86)
Top Overlay:
  lines w8: -124.02,-64.96 -124.02,64.96 124.02,64.96 124.02,-64.96 -124.02,-64.96
Mechanical 16:
  rectangle: -86.81,-137.8 -63.19,-66.93
  rectangle: -36.81,-137.8 -13.19,-66.93
  rectangle: 13.19,-137.8 36.81,-66.93
  rectangle: 63.19,-137.8 86.81,-66.93
  rectangle: 63.19,66.93 86.81,137.8
  rectangle: -86.81,66.93 -63.19,137.8
  rectangle: -37.4,66.93 37.4,137.8